# Altium footprint library custom-case.PcbLib: 381 footprints (part 7 of 24)
Each footprint in its own frame and in the unit in brackets; x right, y up, seen from the top. Pads: shape width x height; smd on the part's side, far side on the other; paste and mask are expansions set on the pad; w line width, h text height; cw(c..) or ccw(c..) is an arc to the next point about the centre after c.
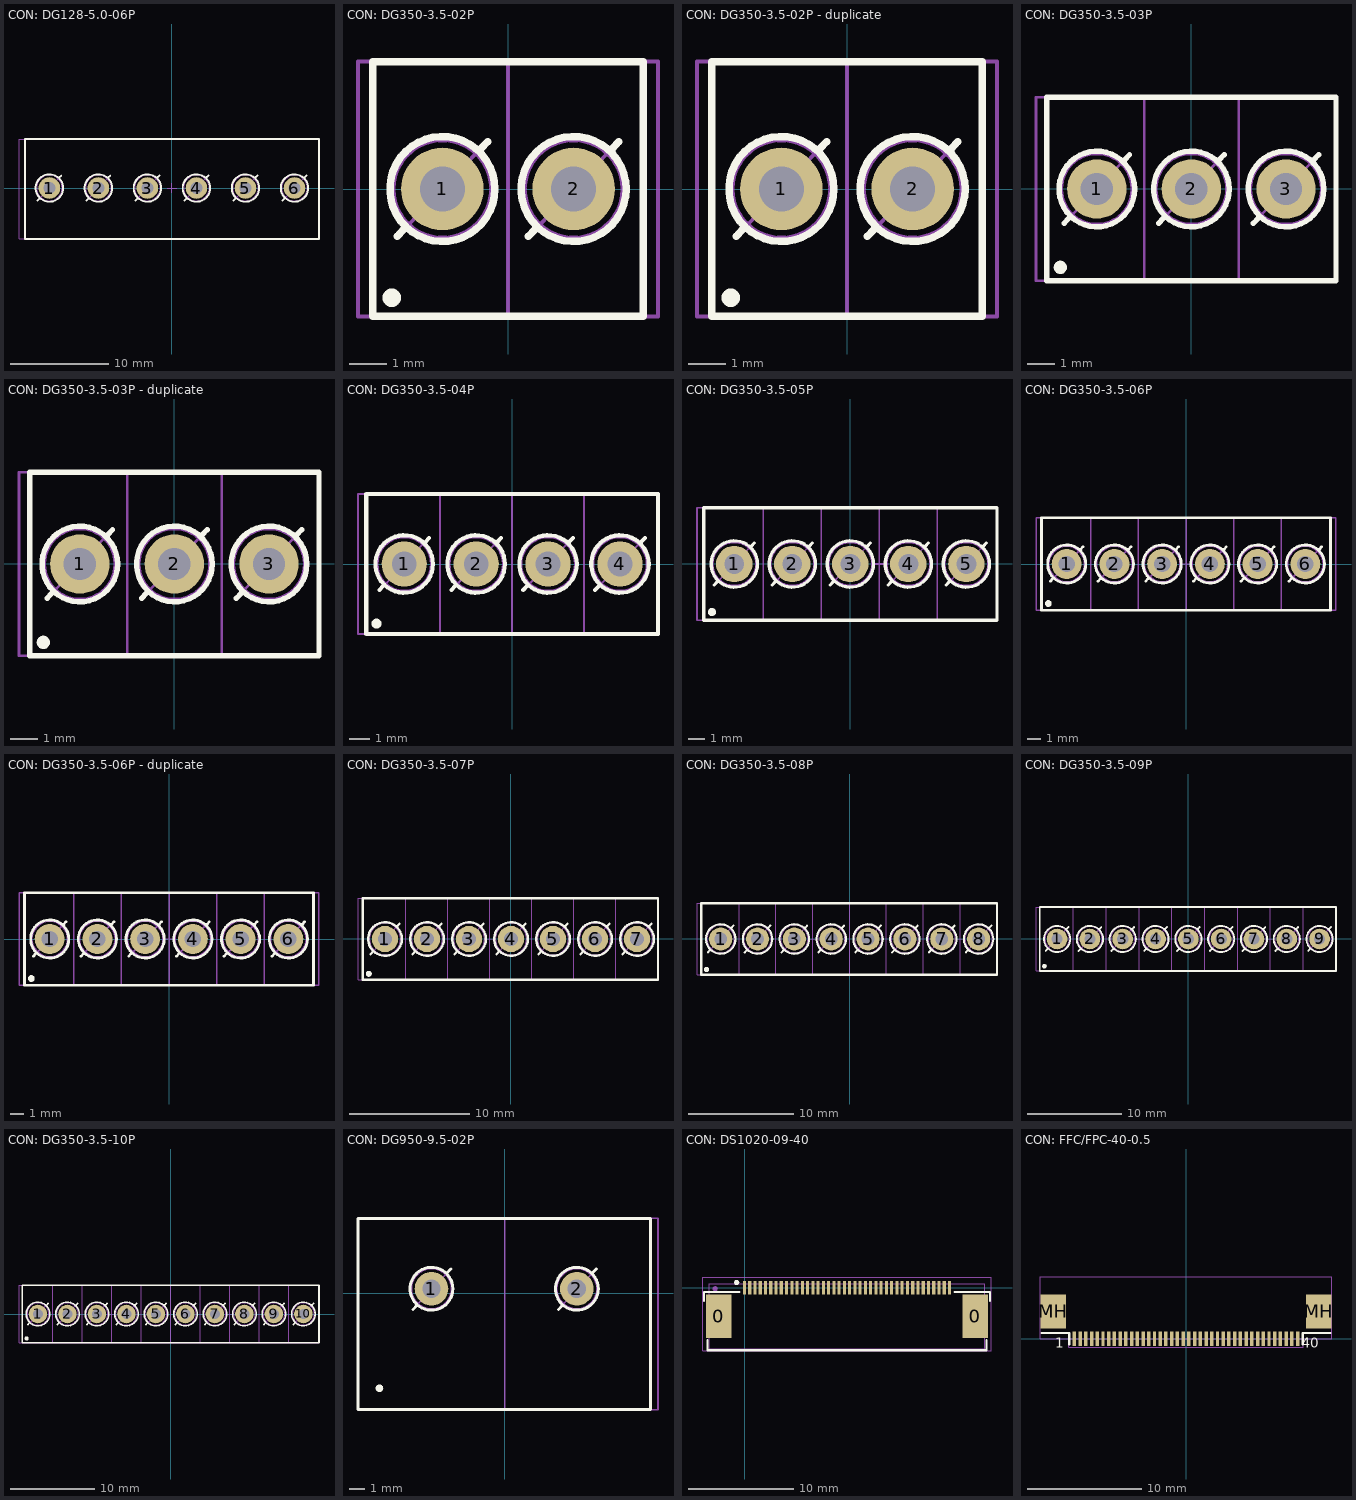
[diagram p6: the footprints below, top view; thin cyan lines are the x and y axes]

## CON: DG128-5.0-06P [mm]
pads (6):
  round 2.2 hole 1.2: 1(-12.5,0) 2(-7.5,0) 3(-2.5,0) 4(2.5,0) 5(7.5,0) 6(12.5,0)
Top Overlay:
  circle w0.2: c-12.5,0 r1.4
  circle w0.2: c-7.5,0 r1.4
  circle w0.2: c-2.5,0 r1.4
  circle w0.2: c2.5,0 r1.4
  circle w0.2: c7.5,0 r1.4
  circle w0.2: c12.5,0 r1.4
  lines w0.2: -13.709,-1.267 -13.526,-1.075 ; -11.474,1.074 -11.291,1.266 ; -8.709,-1.266 -8.526,-1.074 ; -6.474,1.074 -6.291,1.266 ; -3.709,-1.266 -3.526,-1.074 ; -1.474,1.074 -1.291,1.266 ; 1.291,-1.267 1.474,-1.075 ; 3.526,1.074 3.709,1.266 ; 6.291,-1.266 6.474,-1.074 ; 8.526,1.074 8.709,1.266 ; 11.291,-1.267 11.474,-1.075 ; 13.526,1.074 13.709,1.266 ; -15,-5.2 15,-5.2 15,5 -15,5 -15,-5.2
Top Assy:
  circle w0.1: c-12.5,0 r1.3
  circle w0.1: c-7.5,0 r1.3
  circle w0.1: c-2.5,0 r1.3
  circle w0.1: c2.5,0 r1.3
  circle w0.1: c7.5,0 r1.3
  circle w0.1: c12.5,0 r1.3
  lines w0.1: -13.382,-0.931 -11.618,0.931 ; -8.382,-0.931 -6.618,0.931 ; -3.382,-0.931 -1.618,0.931 ; 1.618,-0.931 3.382,0.931 ; 6.618,-0.931 8.382,0.931 ; 11.618,-0.931 13.382,0.931 ; -15.6,-5.2 15,-5.2 15,5 -15.6,5 -15.6,-5.2
Size Area:
  lines w0.1: -0.5,0 0.5,0 ; 0,-0.5 0,0.5 ; -15.6,-5.2 15,-5.2 15,5 -15.6,5 -15.6,-5.2
3D body "DG128-5.0-06.stp": height 14.1, standoff -3.5, extent -15.6,-5.2 15,5

## CON: DG350-3.5-02P [mm]
pads (3):
  round 2.2 hole 1.2: 1(-1.75,0) 2(1.75,0)
  round 0.5 on Top Overlay: ""(-3.1,-2.9)
Top Overlay:
  circle w0.2: c1.75,0 r1.4
  circle w0.2: c-1.75,0 r1.4
  lines w0.2: -2.959,-1.266 -2.776,-1.074 ; -0.724,1.074 -0.541,1.267 ; 0.541,-1.266 0.724,-1.074 ; 2.776,1.074 2.959,1.267 ; -3.6,-3.4 3.6,-3.4 3.6,3.4 -3.6,3.4 -3.6,-3.4
Top Assy:
  circle w0.1: c-1.75,0 r1.3
  circle w0.1: c1.75,0 r1.3
  lines w0.1: -2.632,-0.931 -0.868,0.931 ; 0,-3.4 0,3.4 ; 0.868,-0.931 2.632,0.931 ; -4,-3.4 -4,3.4 4,3.4 4,-3.4 -4,-3.4
Size Area:
  lines w0.1: -4,-3.4 -4,3.4 4,3.4 4,-3.4 -4,-3.4
3D body "User Library-DG350-3,5-02P.STEP": height 8.4, standoff -3.4, extent -4,-3.4 4,3.4

## CON: DG350-3.5-02P - duplicate [mm]
pads (3):
  round 2.2 hole 1.2: 1(-1.75,0) 2(1.75,0)
  round 0.5 on Top Overlay: ""(-3.1,-2.9)
Top Overlay:
  circle w0.2: c-1.75,0 r1.4
  circle w0.2: c1.75,0 r1.4
  lines w0.2: -2.959,-1.266 -2.776,-1.074 ; -0.724,1.074 -0.541,1.267 ; 0.541,-1.266 0.724,-1.074 ; 2.776,1.074 2.959,1.267 ; -3.6,-3.4 -3.6,3.4 3.6,3.4 3.6,-3.4 -3.6,-3.4
Top Assy:
  circle w0.1: c1.75,0 r1.3
  circle w0.1: c-1.75,0 r1.3
  lines w0.1: -2.632,-0.931 -0.868,0.931 ; 0,-3.4 0,3.4 ; 0.868,-0.931 2.632,0.931 ; -4,-3.4 4,-3.4 4,3.4 -4,3.4 -4,-3.4
Size Area:
  lines w0.1: -4,-3.4 4,-3.4 4,3.4 -4,3.4 -4,-3.4
3D body "User Library-DG350-3,5-02P.STEP": height 8.4, standoff -3.4, extent -4,-3.4 4,3.4

## CON: DG350-3.5-03P [mm]
pads (4):
  round 2.2 hole 1.2: 1(-3.5,0) 2(0,0) 3(3.5,0)
  round 0.5 on Top Overlay: ""(-4.85,-2.9)
Top Overlay:
  circle w0.2: c-3.5,0 r1.4
  circle w0.2: c0,0 r1.4
  circle w0.2: c3.5,0 r1.4
  lines w0.2: -4.709,-1.266 -4.526,-1.074 ; -2.474,1.074 -2.291,1.266 ; -1.209,-1.266 -1.026,-1.074 ; 1.026,1.074 1.209,1.266 ; 2.291,-1.266 2.474,-1.074 ; 4.526,1.074 4.709,1.266 ; -5.35,-3.4 -5.35,3.4 5.35,3.4 5.35,-3.4 -5.35,-3.4
Top Assy:
  circle w0.1: c3.5,0 r1.3
  circle w0.1: c0,0 r1.3
  circle w0.1: c-3.5,0 r1.3
  lines w0.1: -4.382,-0.931 -2.618,0.931 ; -1.75,-3.4 -1.75,3.4 ; -0.882,-0.931 0.882,0.931 ; 1.75,-3.4 1.75,3.4 ; 2.618,-0.931 4.382,0.931 ; -5.75,-3.4 5.35,-3.4 5.35,3.4 -5.75,3.4 -5.75,-3.4
Size Area:
  lines w0.1: -5.75,-3.4 5.35,-3.4 5.35,3.4 -5.75,3.4 -5.75,-3.4
3D body "444.STEP": height 8.4, standoff -3.5, extent -5.75,-3.4 5.75,3.4

## CON: DG350-3.5-03P - duplicate [mm]
pads (4):
  round 2.2 hole 1.2: 1(-3.5,0) 2(0,0) 3(3.5,0)
  round 0.5 on Top Overlay: ""(-4.85,-2.9)
Top Overlay:
  circle w0.2: c3.5,0 r1.4
  circle w0.2: c0,0 r1.4
  circle w0.2: c-3.5,0 r1.4
  lines w0.2: -4.709,-1.266 -4.526,-1.074 ; -2.474,1.074 -2.291,1.266 ; -1.209,-1.266 -1.026,-1.074 ; 1.026,1.074 1.209,1.266 ; 2.291,-1.266 2.474,-1.074 ; 4.526,1.074 4.709,1.266 ; -5.35,-3.4 5.35,-3.4 5.35,3.4 -5.35,3.4 -5.35,-3.4
Top Assy:
  circle w0.1: c-3.5,0 r1.3
  circle w0.1: c0,0 r1.3
  circle w0.1: c3.5,0 r1.3
  lines w0.1: -4.382,-0.931 -2.618,0.931 ; -1.75,-3.4 -1.75,3.4 ; -0.882,-0.931 0.882,0.931 ; 1.75,-3.4 1.75,3.4 ; 2.618,-0.931 4.382,0.931 ; -5.75,-3.4 -5.75,3.4 5.35,3.4 5.35,-3.4 -5.75,-3.4
Size Area:
  lines w0.1: -5.75,-3.4 -5.75,3.4 5.35,3.4 5.35,-3.4 -5.75,-3.4
3D body "444.STEP": height 8.4, standoff -3.5, extent -5.75,-3.4 5.75,3.4

## CON: DG350-3.5-04P [mm]
pads (5):
  round 2.2 hole 1.2: 1(-5.25,0) 2(-1.75,0) 3(1.75,0) 4(5.25,0)
  round 0.5 on Top Overlay: ""(-6.6,-2.9)
Top Overlay:
  circle w0.2: c-5.25,0 r1.4
  circle w0.2: c-1.75,0 r1.4
  circle w0.2: c1.75,0 r1.4
  circle w0.2: c5.25,0 r1.4
  lines w0.2: -6.459,-1.266 -6.276,-1.074 ; -4.224,1.074 -4.041,1.267 ; -2.959,-1.266 -2.776,-1.074 ; -0.724,1.074 -0.541,1.267 ; 0.541,-1.266 0.724,-1.074 ; 2.776,1.074 2.959,1.267 ; 4.041,-1.266 4.224,-1.074 ; 6.276,1.074 6.459,1.267 ; -7.1,-3.4 -7.1,3.4 7.1,3.4 7.1,-3.4 -7.1,-3.4
Top Assy:
  circle w0.1: c1.75,0 r1.3
  circle w0.1: c-1.75,0 r1.3
  circle w0.1: c-5.25,0 r1.3
  circle w0.1: c5.25,0 r1.3
  lines w0.1: -6.132,-0.931 -4.368,0.931 ; -3.5,-3.4 -3.5,3.4 ; -2.632,-0.931 -0.868,0.931 ; 0,-3.4 0,3.4 ; 0.868,-0.931 2.632,0.931 ; 3.5,-3.4 3.5,3.4 ; 4.368,-0.931 6.132,0.931 ; -7.5,-3.4 7.1,-3.4 7.1,3.4 -7.5,3.4 -7.5,-3.4
Size Area:
  lines w0.1: -7.5,-3.4 7.1,-3.4 7.1,3.4 -7.5,3.4 -7.5,-3.4
3D body "User Library-DG350-3,5-02P.stp": height 8.4, standoff -3.4, extent -7.5,-3.404 7.5,3.4

## CON: DG350-3.5-05P [mm]
pads (6):
  round 2.2 hole 1.2: 1(-7,0) 2(-3.5,0) 3(0,0) 4(3.5,0) 5(7,0)
  round 0.5 on Top Overlay: ""(-8.35,-2.9)
Top Overlay:
  circle w0.2: c7,0 r1.4
  circle w0.2: c3.5,0 r1.4
  circle w0.2: c0,0 r1.4
  circle w0.2: c-3.5,0 r1.4
  circle w0.2: c-7,0 r1.4
  lines w0.2: -8.209,-1.266 -8.026,-1.074 ; -5.974,1.074 -5.791,1.266 ; -4.709,-1.266 -4.526,-1.074 ; -2.474,1.074 -2.291,1.266 ; -1.209,-1.266 -1.026,-1.074 ; 1.026,1.074 1.209,1.266 ; 2.291,-1.266 2.474,-1.074 ; 4.526,1.074 4.709,1.266 ; 5.791,-1.266 5.974,-1.074 ; 8.026,1.074 8.209,1.266 ; -8.85,-3.4 8.85,-3.4 8.85,3.4 -8.85,3.4 -8.85,-3.4
Top Assy:
  circle w0.1: c-7,0 r1.3
  circle w0.1: c-3.5,0 r1.3
  circle w0.1: c0,0 r1.3
  circle w0.1: c3.5,0 r1.3
  circle w0.1: c7,0 r1.3
  lines w0.1: -7.882,-0.931 -6.118,0.931 ; -5.25,-3.4 -5.25,3.4 ; -4.382,-0.931 -2.618,0.931 ; -1.75,-3.4 -1.75,3.4 ; -0.882,-0.931 0.882,0.931 ; 1.75,-3.4 1.75,3.4 ; 2.618,-0.931 4.382,0.931 ; 5.25,-3.4 5.25,3.4 ; 6.118,-0.931 7.882,0.931 ; -9.25,-3.4 -9.25,3.4 8.85,3.4 8.85,-3.4 -9.25,-3.4
Size Area:
  lines w0.1: 1.3,0 2.25,0 ; 1.75,-0.5 1.75,0.5 ; -9.25,-3.4 -9.25,3.4 8.85,3.4 8.85,-3.4 -9.25,-3.4
3D body "5.stp": height 8.4, standoff -3.5, extent -9.25,-3.4 9.25,3.4

## CON: DG350-3.5-06P [mm]
pads (7):
  round 2.2 hole 1.2: 1(-8.75,0) 2(-5.25,0) 3(-1.75,0) 4(1.75,0) 5(5.25,0) 6(8.75,0)
  round 0.5 on Top Overlay: ""(-10.1,-2.9)
Top Overlay:
  circle w0.2: c-8.75,0 r1.4
  circle w0.2: c-5.25,0 r1.4
  circle w0.2: c-1.75,0 r1.4
  circle w0.2: c1.75,0 r1.4
  circle w0.2: c5.25,0 r1.4
  circle w0.2: c8.75,0 r1.4
  lines w0.2: -9.959,-1.266 -9.776,-1.074 ; -7.724,1.074 -7.541,1.267 ; -6.459,-1.266 -6.276,-1.074 ; -4.224,1.074 -4.041,1.267 ; -2.959,-1.266 -2.776,-1.074 ; -0.724,1.074 -0.541,1.267 ; 0.541,-1.266 0.724,-1.074 ; 2.776,1.074 2.959,1.267 ; 4.041,-1.266 4.224,-1.074 ; 6.276,1.074 6.459,1.267 ; 7.541,-1.266 7.724,-1.074 ; 9.776,1.074 9.959,1.267 ; -10.6,-3.4 -10.6,3.4 10.6,3.4 10.6,-3.4 -10.6,-3.4
Top Assy:
  circle w0.1: c8.75,0 r1.3
  circle w0.1: c5.25,0 r1.3
  circle w0.1: c1.75,0 r1.3
  circle w0.1: c-1.75,0 r1.3
  circle w0.1: c-5.25,0 r1.3
  circle w0.1: c-8.75,0 r1.3
  lines w0.1: -9.632,-0.931 -7.868,0.931 ; -7,-3.4 -7,3.4 ; -6.132,-0.931 -4.368,0.931 ; -3.5,-3.4 -3.5,3.4 ; -2.632,-0.931 -0.868,0.931 ; 0,-3.4 0,3.4 ; 0.868,-0.931 2.632,0.931 ; 3.5,-3.4 3.5,3.4 ; 4.368,-0.931 6.132,0.931 ; 7,-3.4 7,3.4 ; 7.868,-0.931 9.632,0.931 ; -11,-3.4 11,-3.4 11,3.4 -11,3.4 -11,-3.4
Size Area:
  lines w0.1: -0.45,0 0.5,0 ; 0,-0.5 0,0.5 ; -11,-3.4 11,-3.4 11,3.4 -11,3.4 -11,-3.4
3D body "DG350-3.5-06P.SLDPRT": height 8.42, standoff -3.48, extent -11,-3.4 11,3.4

## CON: DG350-3.5-06P - duplicate [mm]
pads (7):
  round 2.2 hole 1.2: 1(-8.75,0) 2(-5.25,0) 3(-1.75,0) 4(1.75,0) 5(5.25,0) 6(8.75,0)
  round 0.5 on Top Overlay: ""(-10.1,-2.9)
Top Overlay:
  circle w0.2: c8.75,0 r1.4
  circle w0.2: c5.25,0 r1.4
  circle w0.2: c1.75,0 r1.4
  circle w0.2: c-1.75,0 r1.4
  circle w0.2: c-5.25,0 r1.4
  circle w0.2: c-8.75,0 r1.4
  lines w0.2: -9.959,-1.266 -9.776,-1.074 ; -7.724,1.074 -7.541,1.267 ; -6.459,-1.266 -6.276,-1.074 ; -4.224,1.074 -4.041,1.267 ; -2.959,-1.266 -2.776,-1.074 ; -0.724,1.074 -0.541,1.267 ; 0.541,-1.266 0.724,-1.074 ; 2.776,1.074 2.959,1.267 ; 4.041,-1.266 4.224,-1.074 ; 6.276,1.074 6.459,1.267 ; 7.541,-1.266 7.724,-1.074 ; 9.776,1.074 9.959,1.267 ; -10.6,-3.4 10.6,-3.4 10.6,3.4 -10.6,3.4 -10.6,-3.4
Top Assy:
  circle w0.1: c-8.75,0 r1.3
  circle w0.1: c-5.25,0 r1.3
  circle w0.1: c-1.75,0 r1.3
  circle w0.1: c1.75,0 r1.3
  circle w0.1: c5.25,0 r1.3
  circle w0.1: c8.75,0 r1.3
  lines w0.1: -9.632,-0.931 -7.868,0.931 ; -7,-3.4 -7,3.4 ; -6.132,-0.931 -4.368,0.931 ; -3.5,-3.4 -3.5,3.4 ; -2.632,-0.931 -0.868,0.931 ; 0,-3.4 0,3.4 ; 0.868,-0.931 2.632,0.931 ; 3.5,-3.4 3.5,3.4 ; 4.368,-0.931 6.132,0.931 ; 7,-3.4 7,3.4 ; 7.868,-0.931 9.632,0.931 ; -11,-3.4 -11,3.4 11,3.4 11,-3.4 -11,-3.4
Size Area:
  lines w0.1: -0.45,0 0.5,0 ; 0,-0.5 0,0.5 ; -11,-3.4 -11,3.4 11,3.4 11,-3.4 -11,-3.4
3D body "6.stp": height 8.4, standoff -3.4, extent -11,-3.4 11,3.4

## CON: DG350-3.5-07P [mm]
pads (8):
  round 2.2 hole 1.2: 1(-10.5,0) 2(-7,0) 3(-3.5,0) 4(0,0) 5(3.5,0) 6(7,0) 7(10.5,0)
  round 0.5 on Top Overlay: ""(-11.85,-2.9)
Top Overlay:
  circle w0.2: c10.5,0 r1.4
  circle w0.2: c-10.5,0 r1.4
  circle w0.2: c-7,0 r1.4
  circle w0.2: c-3.5,0 r1.4
  circle w0.2: c0,0 r1.4
  circle w0.2: c3.5,0 r1.4
  circle w0.2: c7,0 r1.4
  lines w0.2: -11.709,-1.266 -11.526,-1.074 ; -9.474,1.074 -9.291,1.266 ; -8.209,-1.266 -8.026,-1.074 ; -5.974,1.074 -5.791,1.266 ; -4.709,-1.266 -4.526,-1.074 ; -2.474,1.074 -2.291,1.266 ; -1.209,-1.266 -1.026,-1.074 ; 1.026,1.074 1.209,1.266 ; 2.291,-1.266 2.474,-1.074 ; 4.526,1.074 4.709,1.266 ; 5.791,-1.266 5.974,-1.074 ; 8.026,1.074 8.209,1.266 ; 9.291,-1.266 9.474,-1.074 ; 11.526,1.074 11.709,1.266 ; -12.35,-3.4 -12.35,3.4 12.25,3.4 12.25,-3.4 -12.35,-3.4
Top Assy:
  circle w0.1: c10.5,0 r1.3
  circle w0.1: c7,0 r1.3
  circle w0.1: c3.5,0 r1.3
  circle w0.1: c0,0 r1.3
  circle w0.1: c-3.5,0 r1.3
  circle w0.1: c-7,0 r1.3
  circle w0.1: c-10.5,0 r1.3
  lines w0.1: -11.382,-0.931 -9.618,0.931 ; -8.75,-3.4 -8.75,3.4 ; -7.882,-0.931 -6.118,0.931 ; -5.25,-3.4 -5.25,3.4 ; -4.382,-0.931 -2.618,0.931 ; -1.75,-3.4 -1.75,3.4 ; -0.882,-0.931 0.882,0.931 ; 1.75,-3.4 1.75,3.4 ; 2.618,-0.931 4.382,0.931 ; 5.25,-3.4 5.25,3.4 ; 6.118,-0.931 7.882,0.931 ; 8.75,-3.4 8.75,3.4 ; 9.618,-0.931 11.382,0.931 ; 12.25,-3.4 12.25,3.4 ; 12.25,-3.4 -12.75,-3.4 -12.75,3.4 12.25,3.4 ; 12.25,-3.4 12.25,3.4
Size Area:
  lines w0.1: -2.2,0 -1.25,0 ; -1.75,-0.5 -1.75,0.5 ; 12.25,-0.5 12.25,0.5 ; -12.75,-3.4 12.25,-3.4 12.25,3.4 -12.75,3.4 -12.75,-3.4
3D body "7.stp": height 8.4, standoff -3.5, extent -12.75,-3.4 12.75,3.4

## CON: DG350-3.5-08P [mm]
pads (9):
  round 2.2 hole 1.2: 1(-12.25,0) 2(-8.75,0) 3(-5.25,0) 4(-1.75,0) 5(1.75,0) 6(5.25,0) 7(8.75,0) 8(12.25,0)
  round 0.5 on Top Overlay: ""(-13.6,-2.9)
Top Overlay:
  circle w0.2: c5.25,0 r1.4
  circle w0.2: c1.75,0 r1.4
  circle w0.2: c-1.75,0 r1.4
  circle w0.2: c-5.25,0 r1.4
  circle w0.2: c-8.75,0 r1.4
  circle w0.2: c-12.25,0 r1.4
  circle w0.2: c12.25,0 r1.4
  circle w0.2: c8.75,0 r1.4
  lines w0.2: -13.459,-1.266 -13.276,-1.074 ; -11.224,1.074 -11.041,1.266 ; -9.959,-1.266 -9.776,-1.074 ; -7.724,1.074 -7.541,1.266 ; -6.459,-1.266 -6.276,-1.074 ; -4.224,1.074 -4.041,1.266 ; -2.959,-1.266 -2.776,-1.074 ; -0.724,1.074 -0.541,1.266 ; 0.541,-1.266 0.724,-1.074 ; 2.776,1.074 2.959,1.266 ; 4.041,-1.266 4.224,-1.074 ; 6.276,1.074 6.459,1.266 ; 7.541,-1.266 7.724,-1.074 ; 9.776,1.074 9.959,1.266 ; 11.041,-1.266 11.224,-1.074 ; 13.276,1.074 13.459,1.266 ; -14.1,-3.4 14,-3.4 14,3.4 -14.1,3.4 -14.1,-3.4
Top Assy:
  circle w0.1: c-12.25,0 r1.3
  circle w0.1: c-8.75,0 r1.3
  circle w0.1: c-5.25,0 r1.3
  circle w0.1: c-1.75,0 r1.3
  circle w0.1: c1.75,0 r1.3
  circle w0.1: c5.25,0 r1.3
  circle w0.1: c8.75,0 r1.3
  circle w0.1: c12.25,0 r1.3
  lines w0.1: -13.132,-0.931 -11.368,0.931 ; -10.5,-3.4 -10.5,3.4 ; -9.632,-0.931 -7.868,0.931 ; -7,-3.4 -7,3.4 ; -6.132,-0.931 -4.368,0.931 ; -3.5,-3.4 -3.5,3.4 ; -2.632,-0.931 -0.868,0.931 ; 0,-3.4 0,3.4 ; 0.868,-0.931 2.632,0.931 ; 3.5,-3.4 3.5,3.4 ; 4.368,-0.931 6.132,0.931 ; 7,-3.4 7,3.4 ; 7.868,-0.931 9.632,0.931 ; 10.5,-3.4 10.5,3.4 ; 11.368,-0.931 13.132,0.931 ; 14,-3.4 14,3.4 ; 14,-3.4 -14.5,-3.4 -14.5,3.4 14,3.4 ; 14,-3.4 14,3.4
Size Area:
  lines w0.1: -3.95,0 -3,0 ; -3.5,-0.5 -3.5,0.5 ; 10.05,0 11,0 ; 10.5,-0.5 10.5,0.5 ; -14.5,-3.4 -14.5,3.4 14,3.4 14,-3.4 -14.5,-3.4
3D body "8.stp": height 8.4, standoff -3.4, extent -14.5,-3.4 14.5,3.4

## CON: DG350-3.5-09P [mm]
pads (10):
  round 2.2 hole 1.2: 1(-14,0) 2(-10.5,0) 3(-7,0) 4(-3.5,0) 5(0,0) 6(3.5,0) 7(7,0) 8(10.5,0) 9(14,0)
  round 0.5 on Top Overlay: ""(-15.35,-2.9)
Top Overlay:
  circle w0.2: c7,0 r1.4
  circle w0.2: c10.5,0 r1.4
  circle w0.2: c14,0 r1.4
  circle w0.2: c-14,0 r1.4
  circle w0.2: c-10.5,0 r1.4
  circle w0.2: c-7,0 r1.4
  circle w0.2: c-3.5,0 r1.4
  circle w0.2: c0,0 r1.4
  circle w0.2: c3.5,0 r1.4
  lines w0.2: -15.209,-1.266 -15.026,-1.074 ; -12.974,1.074 -12.791,1.266 ; -11.709,-1.266 -11.526,-1.074 ; -9.474,1.074 -9.291,1.266 ; -8.209,-1.266 -8.026,-1.074 ; -5.974,1.074 -5.791,1.266 ; -4.709,-1.266 -4.526,-1.074 ; -2.474,1.074 -2.291,1.266 ; -1.209,-1.266 -1.026,-1.074 ; 1.026,1.074 1.209,1.266 ; 2.291,-1.266 2.474,-1.074 ; 4.526,1.074 4.709,1.266 ; 5.791,-1.266 5.974,-1.074 ; 8.026,1.074 8.209,1.266 ; 9.291,-1.266 9.474,-1.074 ; 11.526,1.074 11.709,1.266 ; 12.791,-1.266 12.974,-1.074 ; 15.026,1.074 15.209,1.266 ; -15.85,-3.4 -15.85,3.4 15.75,3.4 15.75,-3.4 -15.85,-3.4
Top Assy:
  circle w0.1: c14,0 r1.3
  circle w0.1: c10.5,0 r1.3
  circle w0.1: c7,0 r1.3
  circle w0.1: c3.5,0 r1.3
  circle w0.1: c0,0 r1.3
  circle w0.1: c-3.5,0 r1.3
  circle w0.1: c-7,0 r1.3
  circle w0.1: c-10.5,0 r1.3
  circle w0.1: c-14,0 r1.3
  lines w0.1: -14.882,-0.931 -13.118,0.931 ; -12.25,-3.4 -12.25,3.4 ; -11.382,-0.931 -9.618,0.931 ; -8.75,-3.4 -8.75,3.4 ; -7.882,-0.931 -6.118,0.931 ; -5.25,-3.4 -5.25,3.4 ; -4.382,-0.931 -2.618,0.931 ; -1.75,-3.4 -1.75,3.4 ; -0.882,-0.931 0.882,0.931 ; 1.75,-3.4 1.75,3.4 ; 2.618,-0.931 4.382,0.931 ; 5.25,-3.4 5.25,3.4 ; 6.118,-0.931 7.882,0.931 ; 8.75,-3.4 8.75,3.4 ; 9.618,-0.931 11.382,0.931 ; 12.25,-3.4 12.25,3.4 ; 13.118,-0.931 14.882,0.931 ; 15.75,-3.4 15.75,3.4 ; 15.75,-3.4 -16.25,-3.4 -16.25,3.4 15.75,3.4 ; 15.75,-3.4 15.75,3.4
Size Area:
  lines w0.1: -5.7,0 -4.75,0 ; -5.25,-0.5 -5.25,0.5 ; 8.3,0 9.25,0 ; 8.75,-0.5 8.75,0.5 ; -16.25,-3.4 15.75,-3.4 15.75,3.4 -16.25,3.4 -16.25,-3.4
3D body "9.stp": height 8.4, standoff -3.5, extent -16.25,-3.4 16.25,3.4

## CON: DG350-3.5-10P [mm]
pads (11):
  round 2.2 hole 1.2: 1(-15.75,0) 2(-12.25,0) 3(-8.75,0) 4(-5.25,0) 5(-1.75,0) 6(1.75,0) 7(5.25,0) 8(8.75,0) 9(12.25,0) 10(15.75,0)
  round 0.5 on Top Overlay: ""(-17.1,-2.9)
Top Overlay:
  circle w0.2: c5.25,0 r1.4
  circle w0.2: c8.75,0 r1.4
  circle w0.2: c12.25,0 r1.4
  circle w0.2: c15.75,0 r1.4
  circle w0.2: c-15.75,0 r1.4
  circle w0.2: c-12.25,0 r1.4
  circle w0.2: c-8.75,0 r1.4
  circle w0.2: c-5.25,0 r1.4
  circle w0.2: c-1.75,0 r1.4
  circle w0.2: c1.75,0 r1.4
  lines w0.2: -16.959,-1.266 -16.776,-1.074 ; -14.724,1.074 -14.541,1.267 ; -13.459,-1.266 -13.276,-1.074 ; -11.224,1.074 -11.041,1.267 ; -9.959,-1.266 -9.776,-1.074 ; -7.724,1.074 -7.541,1.267 ; -6.459,-1.266 -6.276,-1.074 ; -4.224,1.074 -4.041,1.267 ; -2.959,-1.266 -2.776,-1.074 ; -0.724,1.074 -0.541,1.267 ; 0.541,-1.266 0.724,-1.074 ; 2.776,1.074 2.959,1.267 ; 4.041,-1.266 4.224,-1.074 ; 6.276,1.074 6.459,1.267 ; 7.541,-1.266 7.724,-1.074 ; 9.776,1.074 9.959,1.267 ; 11.041,-1.266 11.224,-1.074 ; 13.276,1.074 13.459,1.267 ; 14.541,-1.266 14.724,-1.074 ; 16.776,1.074 16.959,1.267 ; -17.6,-3.4 -17.6,3.4 17.6,3.4 17.6,-3.4 -17.6,-3.4
Top Assy:
  circle w0.1: c15.75,0 r1.3
  circle w0.1: c12.25,0 r1.3
  circle w0.1: c8.75,0 r1.3
  circle w0.1: c5.25,0 r1.3
  circle w0.1: c1.75,0 r1.3
  circle w0.1: c-1.75,0 r1.3
  circle w0.1: c-5.25,0 r1.3
  circle w0.1: c-8.75,0 r1.3
  circle w0.1: c-12.25,0 r1.3
  circle w0.1: c-15.75,0 r1.3
  lines w0.1: -16.632,-0.931 -14.868,0.931 ; -14,-3.4 -14,3.4 ; -13.132,-0.931 -11.368,0.931 ; -10.5,-3.4 -10.5,3.4 ; -9.632,-0.931 -7.868,0.931 ; -7,-3.4 -7,3.4 ; -6.132,-0.931 -4.368,0.931 ; -3.5,-3.4 -3.5,3.4 ; -2.632,-0.931 -0.868,0.931 ; 0,-3.4 0,3.4 ; 0.868,-0.931 2.632,0.931 ; 3.5,-3.4 3.5,3.4 ; 4.368,-0.931 6.132,0.931 ; 7,-3.4 7,3.4 ; 7.868,-0.931 9.632,0.931 ; 10.5,-3.4 10.5,3.4 ; 11.368,-0.931 13.132,0.931 ; 14,-3.4 14,3.4 ; 14.868,-0.931 16.632,0.931 ; -18,-3.4 17.6,-3.4 17.6,3.4 -18,3.4 -18,-3.4
Size Area:
  lines w0.1: -7.45,0 -6.5,0 ; -7,-0.5 -7,0.5 ; 6.55,0 7.5,0 ; 7,-0.5 7,0.5 ; -18,-3.4 17.6,-3.4 17.6,3.4 -18,3.4 -18,-3.4
3D body "Asm10.stp": height 8.4, standoff -3.4, extent -18,-3.4 18,3.4

## CON: DG950-9.5-02P [mm]
pads (3):
  round 2.2 hole 1.2: 1(-4.8,0.3) 2(4.7,0.3)
  round 0.5 on Top Overlay: ""(-8.2,-6.2)
Top Overlay:
  circle w0.2: c-4.8,0.3 r1.4
  circle w0.2: c4.7,0.3 r1.4
  lines w0.2: -6.002,-1.052 -5.72,-0.756 ; -3.818,1.298 -3.535,1.594 ; 3.498,-1.052 3.781,-0.756 ; 5.682,1.298 5.965,1.594 ; -9.6,-7.6 -9.6,4.9 9.5,4.9 9.5,-7.6 -9.6,-7.6
Top Assy:
  circle w0.1: c-4.8,0.3 r1.3
  circle w0.1: c4.7,0.3 r1.3
  lines w0.1: -5.632,-0.631 -3.9,1.2 ; 0,-7.6 0,4.9 ; 3.868,-0.631 5.6,1.2 ; -9.6,-7.6 -9.6,4.9 10,4.9 10,-7.6 -9.6,-7.6
Size Area:
  lines w0.1: -9.6,-7.6 10,-7.6 10,4.9 -9.6,4.9 -9.6,-7.6
3D body "796739-2.SLDPRT": height 21.65, standoff -4.85, extent -9.62,-7.6 10.02,4.9

## CON: DS1020-09-40 [mm]
pads (44):
  rect 2.4x4.15 smd: 0(-2.45,-2.7) 0(21.95,-2.7)
  rect 0.3x1.25 smd: 1(0,0) 2(0.5,0) 3(1,0) 4(1.5,0) 5(2,0) 6(2.5,0) 7(3,0) 8(3.5,0) 9(4,0) 10(4.5,0) 11(5,0) 12(5.5,0) 13(6,0) 14(6.5,0) 15(7,0) 16(7.5,0) 17(8,0) 18(8.5,0) 19(9,0) 20(9.5,0) 21(10,0) 22(10.5,0) 23(11,0) 24(11.5,0) 25(12,0) 26(12.5,0) 27(13,0) 28(13.5,0) 29(14,0) 30(14.5,0) 31(15,0) 32(15.5,0) 33(16,0) 34(16.5,0) 35(17,0) 36(17.5,0) 37(18,0) 38(18.5,0) 39(19,0) 40(19.5,0)
  round 0.5 on Mech1: ""(-2.8,-0.1)
  round 0.5 on Top Overlay: ""(-0.75,0.5)
Top Overlay:
  lines w0.2: -3.875,-1.25 -3.875,-0.4 -3.85,-0.4 -3.8,-0.4 -0.5,-0.4 ; -3.525,-5 -3.525,-5.95 23,-5.95 23.025,-5.95 23.025,-5 ; 20,-0.4 23.3,-0.4 23.35,-0.4 23.375,-0.4 23.375,-1.25
Top Assy:
  lines w0.1: -3.375,-5.8 22.875,-5.8 22.875,0.4 -3.375,0.4 -3.375,-5.8
Size Area:
  lines w0.1: -4,-6 23.5,-6 23.5,1 -4,1 -4,-6
3D body "4-1734844-0.stp": height 1.88, standoff -0.02, extent -3.375,-5.8 22.875,0.4

## CON: FFC/FPC-40-0.5 [mm]
pads (42):
  rect 0.3x1.25 smd mask+0.075: 1(-9.75,0) 2(-9.25,0) 3(-8.75,0) 4(-8.25,0) 5(-7.75,0) 6(-7.25,0) 7(-6.75,0) 8(-6.25,0) 9(-5.75,0) 10(-5.25,0) 11(-4.75,0) 12(-4.25,0) 13(-3.75,0) 14(-3.25,0) 15(-2.75,0) 16(-2.25,0) 17(-1.75,0) 18(-1.25,0) 19(-0.75,0) 20(-0.25,0) 21(0.25,0) 22(0.75,0) 23(1.25,0) 24(1.75,0) 25(2.25,0) 26(2.75,0) 27(3.25,0) 28(3.75,0) 29(4.25,0) 30(4.75,0) 31(5.25,0) 32(5.75,0) 33(6.25,0) 34(6.75,0) 35(7.25,0) 36(7.75,0) 37(8.25,0) 38(8.75,0) 39(9.25,0) 40(9.75,0)
  rect 2.2x3 smd mask+0.075: MH(-11.6,2.375) MH(11.6,2.375)
Top Overlay:
  lines w0.2: -12.6,0.5 -10.2,0.5 -10.2,-0.5 ; 10.2,-0.5 10.2,0.5 12.6,0.5
  text "40" at 10.087,-1.095 h1.5
  text "1" at -11.419,-1.095 h1.5
Top Assy:
  lines w0.1: -12.75,0 -12.75,5.4 12.75,5.4 12.75,0 -12.75,0
Size Area:
  lines w0.1: -12.75,0 -12.75,1 -12.75,4 -12.75,5.4 12.75,5.4 12.75,4 12.75,1 12.75,0 10.25,0 10.25,-0.75 -10.25,-0.75 -10.25,0 -12.75,0
3D body "affc20-40-050-sht-t.stp": height 2.07, standoff 0.03, extent -12.75,0 12.75,5.4